# Altium footprint library LongMen.PcbLib: 245 footprints (part 2 of 16)
Each footprint in its own frame and in the unit in brackets; x right, y up, seen from the top. Pads: shape width x height; smd on the part's side, far side on the other; paste and mask are expansions set on the pad; w line width, h text height; cw(c..) or ccw(c..) is an arc to the next point about the centre after c.
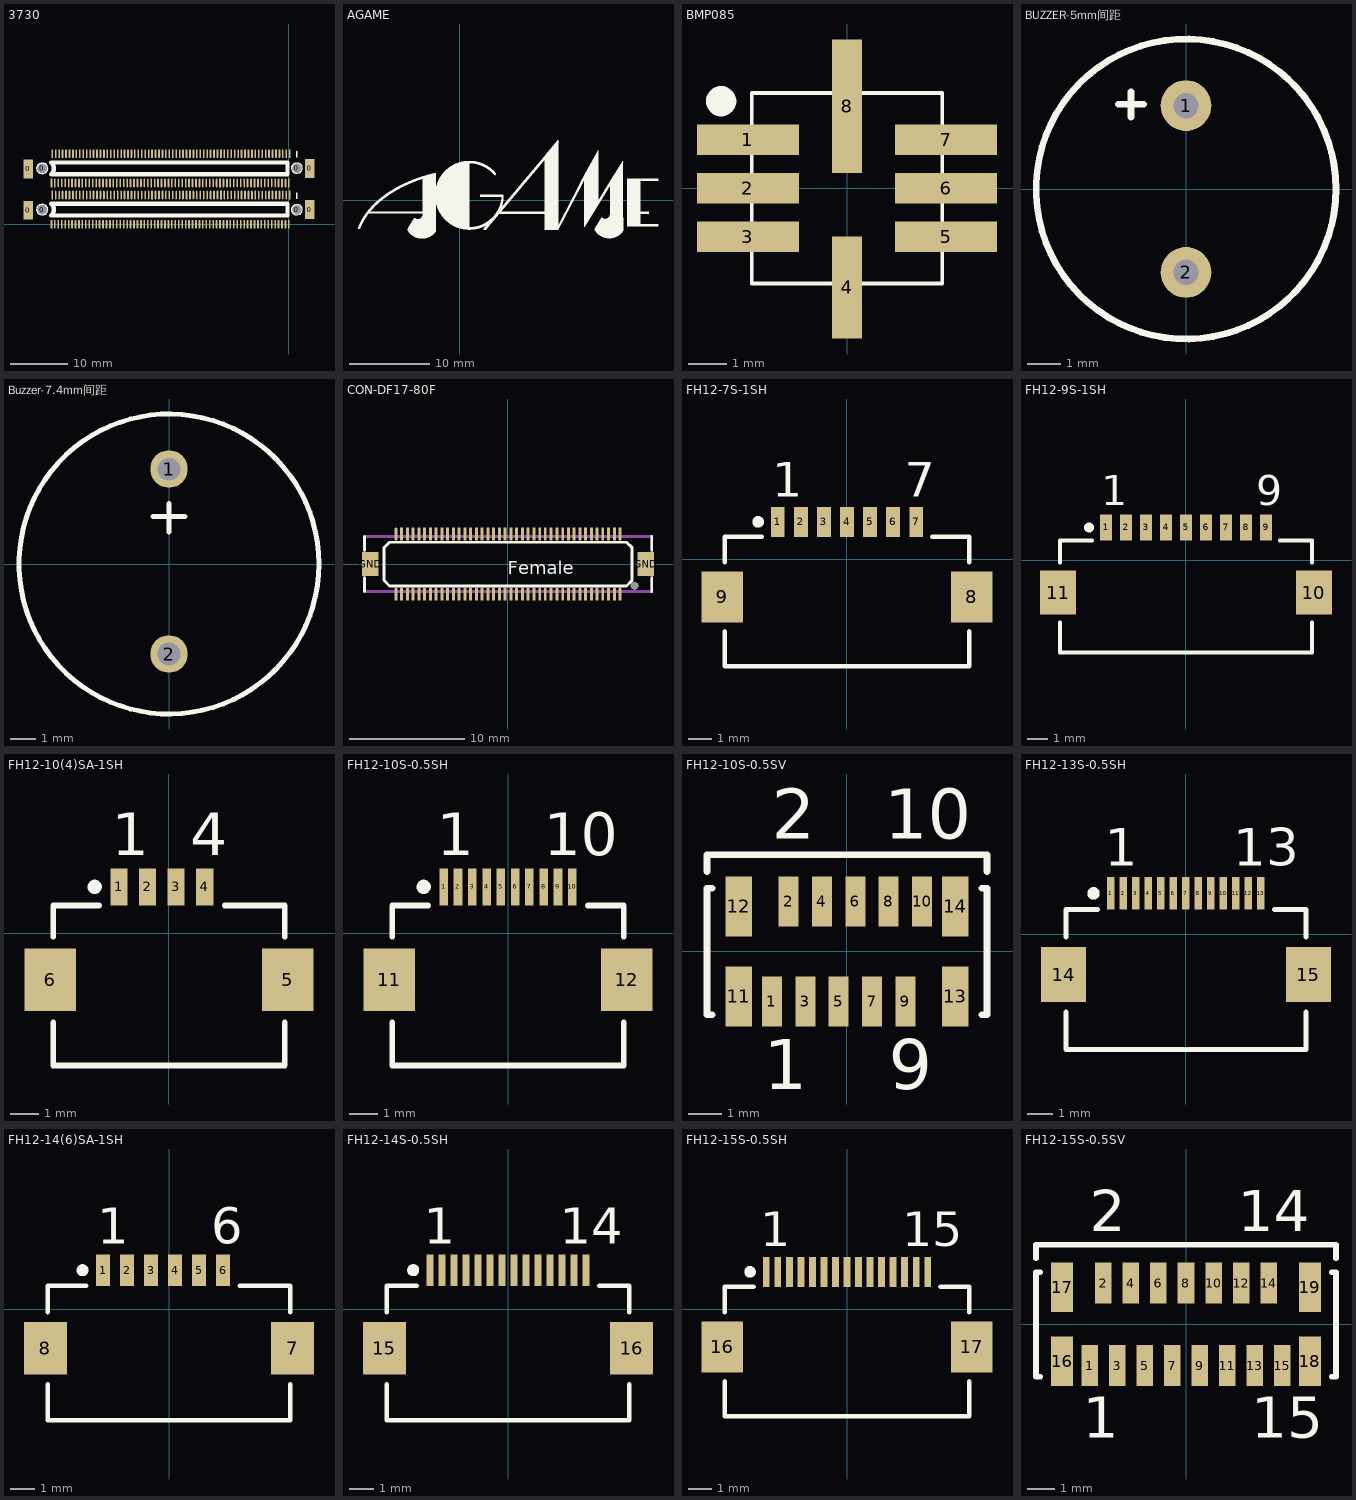
[diagram p1: the footprints below, top view; thin cyan lines are the x and y axes]

## 3730 [mm]
pads (288):
  rect 1.65x3.3 smd: 0(-45.4,9.648) 0(-45.4,2.448) 0(3.6,9.75) 0(3.6,2.55)
  round 1.6 hole 1.6: 0(-43.002,9.74) 0(-43.002,2.54) 0(1.395,2.53) 0(1.395,9.769)
  rect 0.3x1.5 smd: 1(0.152,12.3) 11(-5.848,12.3) 21(-11.848,12.3) 31(-17.848,12.3) 41(-23.848,12.3) 51(-29.848,12.3) 61(-35.848,12.3) 70(-41.248,12.3) 71(-41.4,7.2) 80(-36,7.2) 90(-30,7.2) 100(-24,7.2) 110(-18,7.2) 120(-12,7.2) 130(-6,7.2) 140(0,7.2) 141(0.152,5.1) 151(-5.848,5.1) 161(-11.848,5.1) 171(-17.848,5.1) 181(-23.848,5.1) 191(-29.848,5.1) 201(-35.848,5.1) 210(-41.248,5.1) 211(-41.4,0) 220(-36,0) 230(-30,0) 240(-24,0) 250(-18,0) 260(-12,0) 270(-6,0) 280(0,0)
  oval 0.3x1.5 smd: 2(-0.448,12.3) 3(-1.048,12.3) 4(-1.648,12.3) 5(-2.248,12.3) 6(-2.848,12.3) 7(-3.448,12.3) 8(-4.048,12.3) 9(-4.648,12.3) 10(-5.248,12.3) 12(-6.448,12.3) 13(-7.048,12.3) 14(-7.648,12.3) 15(-8.248,12.3) 16(-8.848,12.3) 17(-9.448,12.3) 18(-10.048,12.3) 19(-10.648,12.3) 20(-11.248,12.3) 22(-12.448,12.3) 23(-13.048,12.3) 24(-13.648,12.3) 25(-14.248,12.3) 26(-14.848,12.3) 27(-15.448,12.3) 28(-16.048,12.3) 29(-16.648,12.3) 30(-17.248,12.3) 32(-18.448,12.3) 33(-19.048,12.3) 34(-19.648,12.3) 35(-20.248,12.3) 36(-20.848,12.3) 37(-21.448,12.3) 38(-22.048,12.3) 39(-22.648,12.3) 40(-23.248,12.3) 42(-24.448,12.3) 43(-25.048,12.3) 44(-25.648,12.3) 45(-26.248,12.3) 46(-26.848,12.3) 47(-27.448,12.3) 48(-28.048,12.3) 49(-28.648,12.3) 50(-29.248,12.3) 52(-30.448,12.3) 53(-31.048,12.3) 54(-31.648,12.3) 55(-32.248,12.3) 56(-32.848,12.3) 57(-33.448,12.3) 58(-34.048,12.3) 59(-34.648,12.3) 60(-35.248,12.3) 62(-36.448,12.3) 63(-37.048,12.3) 64(-37.648,12.3) 65(-38.248,12.3) 66(-38.848,12.3) 67(-39.448,12.3) 68(-40.048,12.3) 69(-40.648,12.3) 72(-40.8,7.2) 73(-40.2,7.2) 74(-39.6,7.2) 75(-39,7.2) 76(-38.4,7.2) 77(-37.8,7.2) 78(-37.2,7.2) 79(-36.6,7.2) 81(-35.4,7.2) 82(-34.8,7.2) 83(-34.2,7.2) 84(-33.6,7.2) 85(-33,7.2) 86(-32.4,7.2) 87(-31.8,7.2) 88(-31.2,7.2) 89(-30.6,7.2) 91(-29.4,7.2) 92(-28.8,7.2) 93(-28.2,7.2) 94(-27.6,7.2) 95(-27,7.2) 96(-26.4,7.2) 97(-25.8,7.2) 98(-25.2,7.2) 99(-24.6,7.2) 101(-23.4,7.2) 102(-22.8,7.2) 103(-22.2,7.2) 104(-21.6,7.2) 105(-21,7.2) 106(-20.4,7.2) 107(-19.8,7.2) 108(-19.2,7.2) 109(-18.6,7.2) 111(-17.4,7.2) 112(-16.8,7.2) 113(-16.2,7.2) 114(-15.6,7.2) 115(-15,7.2) 116(-14.4,7.2) 117(-13.8,7.2) 118(-13.2,7.2) 119(-12.6,7.2) 121(-11.4,7.2) 122(-10.8,7.2) 123(-10.2,7.2) 124(-9.6,7.2) 125(-9,7.2) 126(-8.4,7.2) 127(-7.8,7.2) 128(-7.2,7.2) 129(-6.6,7.2) 131(-5.4,7.2) 132(-4.8,7.2) 133(-4.2,7.2) 134(-3.6,7.2) 135(-3,7.2) 136(-2.4,7.2) 137(-1.8,7.2) 138(-1.2,7.2) 139(-0.6,7.2) 142(-0.448,5.1) 143(-1.048,5.1) 144(-1.648,5.1) 145(-2.248,5.1) 146(-2.848,5.1) 147(-3.448,5.1) 148(-4.048,5.1) 149(-4.648,5.1) 150(-5.248,5.1) 152(-6.448,5.1) 153(-7.048,5.1) 154(-7.648,5.1) 155(-8.248,5.1) 156(-8.848,5.1) 157(-9.448,5.1) 158(-10.048,5.1) 159(-10.648,5.1) 160(-11.248,5.1) 162(-12.448,5.1) 163(-13.048,5.1) 164(-13.648,5.1) 165(-14.248,5.1) 166(-14.848,5.1) 167(-15.448,5.1) 168(-16.048,5.1) 169(-16.648,5.1) 170(-17.248,5.1) 172(-18.448,5.1) 173(-19.048,5.1) 174(-19.648,5.1) 175(-20.248,5.1) 176(-20.848,5.1) 177(-21.448,5.1) 178(-22.048,5.1) 179(-22.648,5.1) 180(-23.248,5.1) 182(-24.448,5.1) 183(-25.048,5.1) 184(-25.648,5.1) 185(-26.248,5.1) 186(-26.848,5.1) 187(-27.448,5.1) 188(-28.048,5.1) 189(-28.648,5.1) 190(-29.248,5.1) 192(-30.448,5.1) 193(-31.048,5.1) 194(-31.648,5.1) 195(-32.248,5.1) 196(-32.848,5.1) 197(-33.448,5.1) 198(-34.048,5.1) 199(-34.648,5.1) 200(-35.248,5.1) 202(-36.448,5.1) 203(-37.048,5.1) 204(-37.648,5.1) 205(-38.248,5.1) 206(-38.848,5.1) 207(-39.448,5.1) 208(-40.048,5.1) 209(-40.648,5.1) 212(-40.8,0) 213(-40.2,0) 214(-39.6,0) 215(-39,0) 216(-38.4,0) 217(-37.8,0) 218(-37.2,0) 219(-36.6,0) 221(-35.4,0) 222(-34.8,0) 223(-34.2,0) 224(-33.6,0) 225(-33,0) 226(-32.4,0) 227(-31.8,0) 228(-31.2,0) 229(-30.6,0) 231(-29.4,0) 232(-28.8,0) 233(-28.2,0) 234(-27.6,0) 235(-27,0) 236(-26.4,0) 237(-25.8,0) 238(-25.2,0) 239(-24.6,0) 241(-23.4,0) 242(-22.8,0) 243(-22.2,0) 244(-21.6,0) 245(-21,0) 246(-20.4,0) 247(-19.8,0) 248(-19.2,0) 249(-18.6,0) 251(-17.4,0) 252(-16.8,0) 253(-16.2,0) 254(-15.6,0) 255(-15,0) 256(-14.4,0) 257(-13.8,0) 258(-13.2,0) 259(-12.6,0) 261(-11.4,0) 262(-10.8,0) 263(-10.2,0) 264(-9.6,0) 265(-9,0) 266(-8.4,0) 267(-7.8,0) 268(-7.2,0) 269(-6.6,0) 271(-5.4,0) 272(-4.8,0) 273(-4.2,0) 274(-3.6,0) 275(-3,0) 276(-2.4,0) 277(-1.8,0) 278(-1.2,0) 279(-0.6,0)
Top Overlay:
  circle w0.254: c-43,2.55 r0.925
  circle w0.254: c1.397,2.54 r0.9
  circle w0.254: c1.397,9.779 r0.9
  circle w0.254: c-43,9.75 r0.925
  lines w0.254: 1.397,4.445 1.397,5.461 ; 1.397,11.684 1.397,12.7
  lines w0.762: -41.4,1.534 ccw(c-42.416,2.55) -41.4,3.566 -0.252,3.566 -0.252,1.534 -41.4,1.534 ; -41.4,8.734 ccw(c-42.416,9.75) -41.4,10.766 -0.252,10.766 -0.252,8.734 -41.4,8.734
3D body: height 1, standoff 0, extent -45.439,0.066 3.656,4.838
3D body: height 1, standoff 0, extent -45.439,7.266 3.656,12.038
3D body: height 4, standoff 0, extent -41.467,1.468 -0.251,3.632
3D body: height 4, standoff 0, extent -41.467,8.668 -0.251,10.832

## AGAME [mm]
Top Overlay:
  drawing of 8748 lines, arcs and shapes, not listed

## BMP085 [mm]
pads (8):
  rect 2.67x0.8 smd: 1(-2.6,1.27) 2(-2.6,0) 3(-2.6,-1.27) 5(2.6,-1.27) 6(2.6,0) 7(2.6,1.27)
  rect 0.8x2.67 smd: 4(0,-2.6)
  rect 0.8x3.5 smd: 8(0,2.151)
Top Overlay:
  circle w0.54: c-3.302,2.286 r0.127
  lines w0.1: -2.5,-2.5 -2.5,2.5 2.5,2.5 2.5,-2.5 -2.5,-2.5
3D body: height 1.16, standoff -0.05, extent -2.5,-2.5 2.5,2.5

## BUZZER-5mm间距 [mil]
height 216.54
pads (2):
  round 60 hole 30: 1(0,98.43) 2(0,-98.43)
Top Overlay:
  circle w7.87: c0,0 r177.17
  lines w7.87: -80,100 -50,100 ; -65,85 -65,115
Mechanical 16:
  lines w3.94: -11.81,-110.24 -11.81,-86.61 11.81,-86.61 11.81,-110.24 -11.81,-110.24 ; -11.81,86.61 -11.81,110.24 11.81,110.24 11.81,86.61 -11.81,86.61
3D body: height 216.54, standoff 0, extent -177.15,-177.15 177.15,177.15
3D body: height 0, standoff -118.11, extent -11.79,86.63 11.79,110.22
3D body: height 0, standoff -118.11, extent -11.79,-110.22 11.79,-86.63

## Buzzer-7.4mm间距 [mm]
height 9.5
pads (2):
  round 1.5 hole 0.9: 1(0,3.8) 2(0,-3.6)
Top Overlay:
  circle w0.2: c0,0 r6
  lines w0.2: -0.635,1.905 0.635,1.905 ; 0,1.27 0,2.413
3D body: height 7.59, standoff -5.5, extent -6.845,-6.718 6.845,6.972

## CON-DF17-80F [mil]
pads (83):
  rrect100% 10x44 smd: 1(-383.86,103)
  rect 10x44 smd: 2(-383.86,-102.36) 3(-364.17,103) 4(-364.17,-102.36) 5(-344.49,103) 6(-344.49,-102.36) 7(-324.8,103) 8(-324.8,-102.36) 9(-305.12,103) 10(-305.12,-102.36) 11(-285.43,103) 12(-285.43,-102.36) 13(-265.75,103) 14(-265.75,-102.36) 15(-246.06,103) 16(-246.06,-102.36) 17(-226.38,103) 18(-226.38,-102.36) 19(-206.69,103) 20(-206.69,-102.36) 21(-187.01,103) 22(-187.01,-102.36) 23(-167.32,103) 24(-167.32,-102.36) 25(-147.64,103) 26(-147.64,-102.36) 27(-127.95,103) 28(-127.95,-102.36) 29(-108.27,103) 30(-108.27,-102.36) 31(-88.58,103) 32(-88.58,-102.36) 33(-68.9,103) 34(-68.9,-102.36) 35(-49.21,103) 36(-49.21,-102.36) 37(-29.53,103) 38(-29.53,-102.36) 39(-9.84,103) 40(-9.84,-102.36) 41(10,103) 42(10,-102.36) 43(30,103) 44(30,-102.36) 45(50,103) 46(50,-102.36) 47(69,103) 48(69,-102.36) 49(89,103) 50(89,-102.36) 51(109,103) 52(109,-102.36) 53(128,103) 54(128,-102.36) 55(148,103) 56(148,-102.36) 57(168,103) 58(168,-102.36) 59(188,103) 60(188,-102.36) 61(207,103) 62(207,-102.36) 63(227,103) 64(227,-102.36) 65(247,103) 66(247,-102.36) 67(266,103) 68(266,-102.36) 69(286,103) 70(286,-102.36) 71(306,103) 72(306,-102.36) 73(325,103) 74(325,-102.36) 75(345,103) 76(345,-102.36) 77(365,103) 78(365,-102.36) 79(384,103) 80(384,-102.36)
  rect 56x83 smd: GND(-472.44,0) GND(473,0)
  round 25.98 hole 26 unplated: hole-2(434,-74.8)
Top Overlay:
  lines w10: -492.13,-94.49 -492.13,-47.24 ; -492.13,48 -492.13,95 ; 493,-94.49 493,-47.24 ; 493,48 493,95 ; -425.2,-55.12 -425.2,56 -405.51,75 406,75 426,56 426,-55.12 406,-74.8 -405.51,-74.8 -425.2,-55.12
  text "Female" at 0,-50 h77.5
Mechanical 16:
  lines w10: -106.3,-74.8 -102.36,-74.8 ; -492.13,-94.49 493,-94.49 493,95 -492.13,95 -492.13,-94.49
3D body: height 118.11, standoff -23.62, extent -491.85,-112.2 492.4,112.21

## FH12-7S-1SH [mm] "Connector; FH12 Series; 7 Position; 1.0mm Spaced Bottom Standard Contact"
height 2
pads (9):
  rect 0.6x1.3 smd: 1(-3,1.625) 2(-2,1.625) 3(-1,1.625) 4(0,1.625) 5(1,1.625) 6(2,1.625) 7(3,1.625)
  rect 1.8x2.2 smd: 8(5.4,-1.625) 9(-5.4,-1.625)
Top Overlay:
  circle w0.25: c-3.85,1.625 r0.125
  lines w0.2: -5.3,-3.125 -5.3,-4.625 5.3,-4.625 5.3,-3.125 ; -5.3,-0.125 -5.3,0.975 -3.7,0.975 ; 3.7,0.975 5.3,0.975 5.3,-0.125
  text "1" at -3.25,2.725 h1.5
  text "7" at 2.5,2.725 h1.5

## FH12-9S-1SH [mm] "Connector; FH12 Series; 9 Position; 1.0mm Spaced Bottom Standard Contact"
height 2
pads (11):
  rect 0.6x1.3 smd: 1(-4,1.625) 2(-3,1.625) 3(-2,1.625) 4(-1,1.625) 5(0,1.625) 6(1,1.625) 7(2,1.625) 8(3,1.625) 9(4,1.625)
  rect 1.8x2.2 smd: 10(6.4,-1.625) 11(-6.4,-1.625)
Top Overlay:
  circle w0.25: c-4.85,1.625 r0.125
  lines w0.2: -6.3,-3.125 -6.3,-4.625 6.3,-4.625 6.3,-3.125 ; -6.3,-0.125 -6.3,0.975 -4.7,0.975 ; 4.7,0.975 6.3,0.975 6.3,-0.125
  text "9" at 3.5,2.725 h1.5
  text "1" at -4.25,2.725 h1.5

## FH12-10(4)SA-1SH [mm] "Connector; FH12 Series; 4 Position; 1.0mm Spaced Bottom Eccentric Contact"
height 2
pads (6):
  rect 0.6x1.3 smd: 1(-1.75,1.625) 2(-0.75,1.625) 3(0.25,1.625) 4(1.25,1.625)
  rect 1.8x2.2 smd: 5(4.15,-1.625) 6(-4.15,-1.625)
Top Overlay:
  circle w0.25: c-2.6,1.625 r0.125
  lines w0.2: -4.05,-3.125 -4.05,-4.625 4.05,-4.625 4.05,-3.125 ; -4.05,-0.125 -4.05,0.975 -2.45,0.975 ; 1.95,0.975 4.05,0.975 4.05,-0.125
  text "4" at 0.75,2.725 h1.5
  text "1" at -2,2.725 h1.5

## FH12-10S-0.5SH [mm] "Connector; FH12 Series; 10 Position; 0.5mm Spaced Bottom Contact"
height 2
pads (12):
  rect 0.3x1.3 smd: 1(-2.25,1.625) 2(-1.75,1.625) 3(-1.25,1.625) 4(-0.75,1.625) 5(-0.25,1.625) 6(0.25,1.625) 7(0.75,1.625) 8(1.25,1.625) 9(1.75,1.625) 10(2.25,1.625)
  rect 1.8x2.2 smd: 11(-4.15,-1.625) 12(4.15,-1.625)
Top Overlay:
  circle w0.25: c-2.95,1.625 r0.125
  lines w0.2: -4.05,-3.125 -4.05,-4.625 4.05,-4.625 4.05,-3.125 ; -4.05,-0.125 -4.05,0.975 -2.8,0.975 ; 2.8,0.975 4.05,0.975 4.05,-0.125
  text "10" at 1.25,2.725 h1.5
  text "1" at -2.5,2.725 h1.5

## FH12-10S-0.5SV [mm] "Connector; FH12 Series; 10 Position; 0.5mm Spaced Vertical Mounting"
height 4.85
pads (14):
  rect 0.6x1.5 smd: 1(-2.25,-1.5) 2(-1.75,1.5) 3(-1.25,-1.5) 4(-0.75,1.5) 5(-0.25,-1.5) 6(0.25,1.5) 7(0.75,-1.5) 8(1.25,1.5) 9(1.75,-1.5) 10(2.25,1.5)
  rect 0.8x1.8 smd: 11(-3.25,-1.35) 12(-3.25,1.35) 13(3.25,-1.35) 14(3.25,1.35)
Top Overlay:
  lines w0.2: -4.2,2.4 -4.2,2.9 4.2,2.9 4.2,2.4 ; -4.05,-1.9 -4.2,-1.9 -4.2,1.9 -4.05,1.9 ; 4.05,-1.9 4.2,-1.9 4.2,1.9 4.05,1.9
  text "9" at 1.25,-4.125 h1.5
  text "10" at 1.125,3.375 h1.5
  text "1" at -2.5,-4.125 h1.5
  text "2" at -2.25,3.375 h1.5

## FH12-13S-0.5SH [mm] "Connector; FH12 Series; 13 Position; 0.5mm Spaced Bottom Contact"
height 2
pads (15):
  rect 0.3x1.3 smd: 1(-3,1.625) 2(-2.5,1.625) 3(-2,1.625) 4(-1.5,1.625) 5(-1,1.625) 6(-0.5,1.625) 7(0,1.625) 8(0.5,1.625) 9(1,1.625) 10(1.5,1.625) 11(2,1.625) 12(2.5,1.625) 13(3,1.625)
  rect 1.8x2.2 smd: 14(-4.9,-1.625) 15(4.9,-1.625)
Top Overlay:
  circle w0.25: c-3.7,1.625 r0.125
  lines w0.2: -4.8,-3.125 -4.8,-4.625 4.8,-4.625 4.8,-3.125 ; -4.8,-0.125 -4.8,0.975 -3.55,0.975 ; 3.55,0.975 4.8,0.975 4.8,-0.125
  text "13" at 1.9,2.725 h1.5
  text "1" at -3.25,2.725 h1.5

## FH12-14(6)SA-1SH [mm] "Connector; FH12 Series; 6 Position; 1.0mm Spaced Bottom Eccentric Contact"
height 2
pads (8):
  rect 0.6x1.3 smd: 1(-2.75,1.625) 2(-1.75,1.625) 3(-0.75,1.625) 4(0.25,1.625) 5(1.25,1.625) 6(2.25,1.625)
  rect 1.8x2.2 smd: 7(5.15,-1.625) 8(-5.15,-1.625)
Top Overlay:
  circle w0.25: c-3.6,1.625 r0.125
  lines w0.2: -5.05,-3.125 -5.05,-4.625 5.05,-4.625 5.05,-3.125 ; -5.05,-0.125 -5.05,0.975 -3.45,0.975 ; 2.95,0.975 5.05,0.975 5.05,-0.125
  text "6" at 1.75,2.725 h1.5
  text "1" at -3,2.725 h1.5

## FH12-14S-0.5SH [mm] "Connector; FH12 Series; 14 Position; 0.5mm Spaced Bottom Contact"
height 2
pads (16):
  rect 0.3x1.3 smd: 1(-3.25,1.625) 2(-2.75,1.625) 3(-2.25,1.625) 4(-1.75,1.625) 5(-1.25,1.625) 6(-0.75,1.625) 7(-0.25,1.625) 8(0.25,1.625) 9(0.75,1.625) 10(1.25,1.625) 11(1.75,1.625) 12(2.25,1.625) 13(2.75,1.625) 14(3.25,1.625)
  rect 1.8x2.2 smd: 15(-5.15,-1.625) 16(5.15,-1.625)
Top Overlay:
  circle w0.25: c-3.95,1.625 r0.125
  lines w0.2: -5.05,-3.125 -5.05,-4.625 5.05,-4.625 5.05,-3.125 ; -5.05,-0.125 -5.05,0.975 -3.8,0.975 ; 3.8,0.975 5.05,0.975 5.05,-0.125
  text "1" at -3.5,2.725 h1.5
  text "14" at 2.15,2.725 h1.5

## FH12-15S-0.5SH [mm] "Connector; FH12 Series; 15 Position; 0.5mm Spaced Bottom Contact"
height 2
pads (17):
  rect 0.3x1.3 smd: 1(-3.5,1.625) 2(-3,1.625) 3(-2.5,1.625) 4(-2,1.625) 5(-1.5,1.625) 6(-1,1.625) 7(-0.5,1.625) 8(0,1.625) 9(0.5,1.625) 10(1,1.625) 11(1.5,1.625) 12(2,1.625) 13(2.5,1.625) 14(3,1.625) 15(3.5,1.625)
  rect 1.8x2.2 smd: 16(-5.4,-1.625) 17(5.4,-1.625)
Top Overlay:
  circle w0.25: c-4.2,1.625 r0.125
  lines w0.2: -5.3,-3.125 -5.3,-4.625 5.3,-4.625 5.3,-3.125 ; -5.3,-0.125 -5.3,0.975 -4.05,0.975 ; 4.05,0.975 5.3,0.975 5.3,-0.125
  text "15" at 2.4,2.725 h1.5
  text "1" at -3.75,2.725 h1.5

## FH12-15S-0.5SV [mm] "Connector; FH12 Series; 15 Position; 0.5mm Spaced Vertical Mounting"
height 4.85
pads (19):
  rect 0.6x1.5 smd: 1(-3.5,-1.5) 2(-3,1.5) 3(-2.5,-1.5) 4(-2,1.5) 5(-1.5,-1.5) 6(-1,1.5) 7(-0.5,-1.5) 8(0,1.5) 9(0.5,-1.5) 10(1,1.5) 11(1.5,-1.5) 12(2,1.5) 13(2.5,-1.5) 14(3,1.5) 15(3.5,-1.5)
  rect 0.8x1.8 smd: 16(-4.5,-1.35) 17(-4.5,1.35) 18(4.5,-1.35) 19(4.5,1.35)
Top Overlay:
  lines w0.2: -5.45,2.4 -5.45,2.9 5.45,2.9 5.45,2.4 ; -5.3,-1.9 -5.45,-1.9 -5.45,1.9 -5.3,1.9 ; 5.3,-1.9 5.45,-1.9 5.45,1.9 5.3,1.9
  text "14" at 1.875,3.375 h1.5
  text "1" at -3.75,-4.125 h1.5
  text "2" at -3.5,3.375 h1.5
  text "15" at 2.375,-4.125 h1.5